# Altium schematic symbol library TI Power Management Shunt Voltage Reference.SchLib: 1526 symbols (part 14 of 18) (continued)
## TLV431AIDBVR
designator U?
Low Voltage Adjustable Precision Shunt Regulator, 39 ppm / degC, 15 mA, -40 to 85 degC, 5-pin SOT-23 (DBV), Green (RoHS & no Sb/Br); Manufacturer: Texas Instruments; PartNumber: TLV431AIDBVR; Initial Accuracy @ 25/deg C(%): 1; Iout/Iz(Max)(mA): 15; Min Iz for Regulation(uA): 80; Rating: Catalog; SubFamily: Shunt Voltage Reference; Temp Coeff(Max)(ppm/ degree C): 129; Temp Coeff(Typ)(ppm/ degree C): 39; VO Adj(Max)(V): 6; VO Adj(Min)(V): 1.24; DatasheetVersion: SLVS139T; PackageVersion: 4073253-4/K; PackageReference: DBV5; PackageDescription: 5-Pin Plastic Small Outline, Body 1.60 ?2.90 mm, Pitch 0.95 mm; Supplier 1: Digi-Key; Supplier Part Number 1: 296-1984-2-ND; Supplier 2: Digi-Key; Supplier Part Number 2: 296-1984-1-ND; Supplier 3: Digi-Key; Supplier Part Number 3: 296-1984-6-ND; Supplier 4: Farnell; Supplier Part Number 4: 1287671; Supplier 5: Newark; Supplier Part Number 5: 76C8858; Supplier 6: Mouser; Supplier Part Number 6: 595-TLV431AIDBVR; Eco-Plan: Green (RoHS & no Sb/Br); Mounting Technology: Surface Mount; Code_JEDEC: MO-178; ComponentLink1Description: Manufacturer URL; ComponentLink1URL: http://www.ti.com/; ComponentLink2Description: Datasheet; ComponentLink2URL: http://www.ti.com/general/docs/lit/getliterature.tsp?genericPartNumber=TLV431A&fileType=pdf; ComponentLink3Description: Package Specification; ComponentLink3URL: http://www.ti.com/litv/pdf/mpds018i
footprint TI-DBV5_N (SOT23, 5-Leads, Body 2.9x1.6mm, Pitch 0.95mm, IPC Medium Density)
part A pins: 3 CATHODE, 4 REF (in), 5 ANODE
part B pins: 1 NC "No internal connection", 2 NC "No internal connection"

## TLV431AIDBVRE4
designator U?
Low Voltage Adjustable Precision Shunt Regulator, 39 ppm / degC, 15 mA, -40 to 85 degC, 5-pin SOT-23 (DBV), Green (RoHS & no Sb/Br); Manufacturer: Texas Instruments; PartNumber: TLV431AIDBVRE4; Initial Accuracy @ 25/deg C(%): 1; Iout/Iz(Max)(mA): 15; Min Iz for Regulation(uA): 80; Rating: Catalog; SubFamily: Shunt Voltage Reference; Temp Coeff(Max)(ppm/ degree C): 129; Temp Coeff(Typ)(ppm/ degree C): 39; VO Adj(Max)(V): 6; VO Adj(Min)(V): 1.24; DatasheetVersion: SLVS139T; PackageVersion: 4073253-4/K; PackageReference: DBV5; PackageDescription: 5-Pin Plastic Small Outline, Body 1.60 ?2.90 mm, Pitch 0.95 mm; Supplier 1: Digi-Key; Supplier Part Number 1: TLV431AIDBVRE4-ND; Supplier 2: Farnell; Supplier Part Number 2: 1287672; Supplier 3: Newark; Supplier Part Number 3: 26M4183; Supplier 4: Mouser; Supplier Part Number 4: 595-TLV431AIDBVRE4; Eco-Plan: Green (RoHS & no Sb/Br); Mounting Technology: Surface Mount; Code_JEDEC: MO-178; ComponentLink1Description: Manufacturer URL; ComponentLink1URL: http://www.ti.com/; ComponentLink2Description: Datasheet; ComponentLink2URL: http://www.ti.com/general/docs/lit/getliterature.tsp?genericPartNumber=TLV431A&fileType=pdf; ComponentLink3Description: Package Specification; ComponentLink3URL: http://www.ti.com/litv/pdf/mpds018i
footprint TI-DBV5_N (SOT23, 5-Leads, Body 2.9x1.6mm, Pitch 0.95mm, IPC Medium Density)
part A pins: 3 CATHODE, 4 REF (in), 5 ANODE
part B pins: 1 NC "No internal connection", 2 NC "No internal connection"

## TLV431AIDBVRG4
designator U?
Low Voltage Adjustable Precision Shunt Regulator, 39 ppm / degC, 15 mA, -40 to 85 degC, 5-pin SOT-23 (DBV), Green (RoHS & no Sb/Br); Manufacturer: Texas Instruments; PartNumber: TLV431AIDBVRG4; Initial Accuracy @ 25/deg C(%): 1; Iout/Iz(Max)(mA): 15; Min Iz for Regulation(uA): 80; Rating: Catalog; SubFamily: Shunt Voltage Reference; Temp Coeff(Max)(ppm/ degree C): 129; Temp Coeff(Typ)(ppm/ degree C): 39; VO Adj(Max)(V): 6; VO Adj(Min)(V): 1.24; DatasheetVersion: SLVS139T; PackageVersion: 4073253-4/K; PackageReference: DBV5; PackageDescription: 5-Pin Plastic Small Outline, Body 1.60 ?2.90 mm, Pitch 0.95 mm; Supplier 1: Digi-Key; Supplier Part Number 1: TLV431AIDBVRG4-ND; Supplier 2: Newark; Supplier Part Number 2: 46M9061; Supplier 3: Mouser; Supplier Part Number 3: 595-TLV431AIDBVRG4; Eco-Plan: Green (RoHS & no Sb/Br); Mounting Technology: Surface Mount; Code_JEDEC: MO-178; ComponentLink1Description: Manufacturer URL; ComponentLink1URL: http://www.ti.com/; ComponentLink2Description: Datasheet; ComponentLink2URL: http://www.ti.com/general/docs/lit/getliterature.tsp?genericPartNumber=TLV431A&fileType=pdf; ComponentLink3Description: Package Specification; ComponentLink3URL: http://www.ti.com/litv/pdf/mpds018i
footprint TI-DBV5_N (SOT23, 5-Leads, Body 2.9x1.6mm, Pitch 0.95mm, IPC Medium Density)
part A pins: 3 CATHODE, 4 REF (in), 5 ANODE
part B pins: 1 NC "No internal connection", 2 NC "No internal connection"

## TLV431AIDBVT
designator U?
Low Voltage Adjustable Precision Shunt Regulator, 39 ppm / degC, 15 mA, -40 to 85 degC, 5-pin SOT-23 (DBV), Green (RoHS & no Sb/Br); Manufacturer: Texas Instruments; PartNumber: TLV431AIDBVT; Initial Accuracy @ 25/deg C(%): 1; Iout/Iz(Max)(mA): 15; Min Iz for Regulation(uA): 80; Rating: Catalog; SubFamily: Shunt Voltage Reference; Temp Coeff(Max)(ppm/ degree C): 129; Temp Coeff(Typ)(ppm/ degree C): 39; VO Adj(Max)(V): 6; VO Adj(Min)(V): 1.24; DatasheetVersion: SLVS139T; PackageVersion: 4073253-4/K; PackageReference: DBV5; PackageDescription: 5-Pin Plastic Small Outline, Body 1.60 ?2.90 mm, Pitch 0.95 mm; Supplier 1: Digi-Key; Supplier Part Number 1: 296-26826-2-ND; Supplier 2: Digi-Key; Supplier Part Number 2: 296-26826-1-ND; Supplier 3: Digi-Key; Supplier Part Number 3: 296-26826-6-ND; Supplier 4: Newark; Supplier Part Number 4: 67H1744; Supplier 5: Mouser; Supplier Part Number 5: 595-TLV431AIDBVT; Eco-Plan: Green (RoHS & no Sb/Br); Mounting Technology: Surface Mount; Code_JEDEC: MO-178; ComponentLink1Description: Manufacturer URL; ComponentLink1URL: http://www.ti.com/; ComponentLink2Description: Datasheet; ComponentLink2URL: http://www.ti.com/general/docs/lit/getliterature.tsp?genericPartNumber=TLV431A&fileType=pdf; ComponentLink3Description: Package Specification; ComponentLink3URL: http://www.ti.com/litv/pdf/mpds018i
footprint TI-DBV5_N (SOT23, 5-Leads, Body 2.9x1.6mm, Pitch 0.95mm, IPC Medium Density)
part A pins: 3 CATHODE, 4 REF (in), 5 ANODE
part B pins: 1 NC "No internal connection", 2 NC "No internal connection"

## TLV431AIDBVTE4
designator U?
Low Voltage Adjustable Precision Shunt Regulator, 39 ppm / degC, 15 mA, -40 to 85 degC, 5-pin SOT-23 (DBV), Green (RoHS & no Sb/Br); Manufacturer: Texas Instruments; PartNumber: TLV431AIDBVTE4; Initial Accuracy @ 25/deg C(%): 1; Iout/Iz(Max)(mA): 15; Min Iz for Regulation(uA): 80; Rating: Catalog; SubFamily: Shunt Voltage Reference; Temp Coeff(Max)(ppm/ degree C): 129; Temp Coeff(Typ)(ppm/ degree C): 39; VO Adj(Max)(V): 6; VO Adj(Min)(V): 1.24; DatasheetVersion: SLVS139T; PackageVersion: 4073253-4/K; PackageReference: DBV5; PackageDescription: 5-Pin Plastic Small Outline, Body 1.60 ?2.90 mm, Pitch 0.95 mm; Supplier 1: Digi-Key; Supplier Part Number 1: TLV431AIDBVTE4-ND; Supplier 2: Mouser; Supplier Part Number 2: 595-TLV431AIDBVTE4; Eco-Plan: Green (RoHS & no Sb/Br); Mounting Technology: Surface Mount; Code_JEDEC: MO-178; ComponentLink1Description: Manufacturer URL; ComponentLink1URL: http://www.ti.com/; ComponentLink2Description: Datasheet; ComponentLink2URL: http://www.ti.com/general/docs/lit/getliterature.tsp?genericPartNumber=TLV431A&fileType=pdf; ComponentLink3Description: Package Specification; ComponentLink3URL: http://www.ti.com/litv/pdf/mpds018i
footprint TI-DBV5_N (SOT23, 5-Leads, Body 2.9x1.6mm, Pitch 0.95mm, IPC Medium Density)
part A pins: 3 CATHODE, 4 REF (in), 5 ANODE
part B pins: 1 NC "No internal connection", 2 NC "No internal connection"

## TLV431AIDBVTG4
designator U?
Low Voltage Adjustable Precision Shunt Regulator, 39 ppm / degC, 15 mA, -40 to 85 degC, 5-pin SOT-23 (DBV), Green (RoHS & no Sb/Br); Manufacturer: Texas Instruments; PartNumber: TLV431AIDBVTG4; Initial Accuracy @ 25/deg C(%): 1; Iout/Iz(Max)(mA): 15; Min Iz for Regulation(uA): 80; Rating: Catalog; SubFamily: Shunt Voltage Reference; Temp Coeff(Max)(ppm/ degree C): 129; Temp Coeff(Typ)(ppm/ degree C): 39; VO Adj(Max)(V): 6; VO Adj(Min)(V): 1.24; DatasheetVersion: SLVS139T; PackageVersion: 4073253-4/K; PackageReference: DBV5; PackageDescription: 5-Pin Plastic Small Outline, Body 1.60 ?2.90 mm, Pitch 0.95 mm; Supplier 1: Digi-Key; Supplier Part Number 1: TLV431AIDBVTG4-ND; Supplier 2: Newark; Supplier Part Number 2: 46M9062; Supplier 3: Mouser; Supplier Part Number 3: 595-TLV431AIDBVTG4; Eco-Plan: Green (RoHS & no Sb/Br); Mounting Technology: Surface Mount; Code_JEDEC: MO-178; ComponentLink1Description: Manufacturer URL; ComponentLink1URL: http://www.ti.com/; ComponentLink2Description: Datasheet; ComponentLink2URL: http://www.ti.com/general/docs/lit/getliterature.tsp?genericPartNumber=TLV431A&fileType=pdf; ComponentLink3Description: Package Specification; ComponentLink3URL: http://www.ti.com/litv/pdf/mpds018i
footprint TI-DBV5_N (SOT23, 5-Leads, Body 2.9x1.6mm, Pitch 0.95mm, IPC Medium Density)
part A pins: 3 CATHODE, 4 REF (in), 5 ANODE
part B pins: 1 NC "No internal connection", 2 NC "No internal connection"

## TLV431AIDBZR
designator U?
Low Voltage Adjustable Precision Shunt Regulator, 39 ppm / degC, 15 mA, -40 to 85 degC, 3-pin SOT-23 (DBZ), Green (RoHS & no Sb/Br); Manufacturer: Texas Instruments; PartNumber: TLV431AIDBZR; Initial Accuracy @ 25/deg C(%): 1; Iout/Iz(Max)(mA): 15; Min Iz for Regulation(uA): 80; Rating: Catalog; SubFamily: Shunt Voltage Reference; Temp Coeff(Max)(ppm/ degree C): 129; Temp Coeff(Typ)(ppm/ degree C): 39; VO Adj(Max)(V): 6; VO Adj(Min)(V): 1.24; DatasheetVersion: SLVS139T; PackageVersion: 4203227/B; PackageReference: DBZ3; PackageDescription: 3-Pin Plastic Small Outline, Body 2.92 x 1.3 mm, Pitch 0.95 mm; Supplier 1: Digi-Key; Supplier Part Number 1: 296-18913-2-ND; Supplier 2: Digi-Key; Supplier Part Number 2: 296-18913-1-ND; Supplier 3: Digi-Key; Supplier Part Number 3: 296-18913-6-ND; Supplier 4: Farnell; Supplier Part Number 4: 2144315; Supplier 5: Newark; Supplier Part Number 5: 21J9151; Supplier 6: Newark; Supplier Part Number 6: 46W1551; Supplier 7: Mouser; Supplier Part Number 7: 595-TLV431AIDBZR; Eco-Plan: Green (RoHS & no Sb/Br); Mounting Technology: Surface Mount; Code_JEDEC: TO-236; ComponentLink1Description: Manufacturer URL; ComponentLink1URL: http://www.ti.com/; ComponentLink2Description: Datasheet; ComponentLink2URL: http://www.ti.com/general/docs/lit/getliterature.tsp?genericPartNumber=TLV431A&fileType=pdf; ComponentLink3Description: Package Specification; ComponentLink3URL: http://www.ti.com/litv/pdf/mpds108a
footprint TI-DBZ3_N (SOT23, 3-Leads, Body 2.92x1.3 mm, Pitch 0.95 mm, IPC Medium Density)
pins: 1 REF (in), 2 CATHODE, 3 ANODE

## TLV431AIDBZRG4
designator U?
Low Voltage Adjustable Precision Shunt Regulator, 39 ppm / degC, 15 mA, -40 to 85 degC, 3-pin SOT-23 (DBZ), Green (RoHS & no Sb/Br); Manufacturer: Texas Instruments; PartNumber: TLV431AIDBZRG4; Initial Accuracy @ 25/deg C(%): 1; Iout/Iz(Max)(mA): 15; Min Iz for Regulation(uA): 80; Rating: Catalog; SubFamily: Shunt Voltage Reference; Temp Coeff(Max)(ppm/ degree C): 129; Temp Coeff(Typ)(ppm/ degree C): 39; VO Adj(Max)(V): 6; VO Adj(Min)(V): 1.24; DatasheetVersion: SLVS139T; PackageVersion: 4203227/B; PackageReference: DBZ3; PackageDescription: 3-Pin Plastic Small Outline, Body 2.92 x 1.3 mm, Pitch 0.95 mm; Supplier 1: Digi-Key; Supplier Part Number 1: TLV431AIDBZRG4-ND; Supplier 2: Newark; Supplier Part Number 2: 31K7720; Supplier 3: Mouser; Supplier Part Number 3: 595-TLV431AIDBZRG4; Eco-Plan: Green (RoHS & no Sb/Br); Mounting Technology: Surface Mount; Code_JEDEC: TO-236; ComponentLink1Description: Manufacturer URL; ComponentLink1URL: http://www.ti.com/; ComponentLink2Description: Datasheet; ComponentLink2URL: http://www.ti.com/general/docs/lit/getliterature.tsp?genericPartNumber=TLV431A&fileType=pdf; ComponentLink3Description: Package Specification; ComponentLink3URL: http://www.ti.com/litv/pdf/mpds108a
footprint TI-DBZ3_N (SOT23, 3-Leads, Body 2.92x1.3 mm, Pitch 0.95 mm, IPC Medium Density)
pins: 1 REF (in), 2 CATHODE, 3 ANODE

## TLV431AIDE4
designator U?
Low Voltage Adjustable Precision Shunt Regulator, 39 ppm / degC, 15 mA, -40 to 85 degC, 8-pin SOIC (D), Green (RoHS & no Sb/Br); Manufacturer: Texas Instruments; PartNumber: TLV431AIDE4; Initial Accuracy @ 25/deg C(%): 1; Iout/Iz(Max)(mA): 15; Min Iz for Regulation(uA): 80; Rating: Catalog; SubFamily: Shunt Voltage Reference; Temp Coeff(Max)(ppm/ degree C): 129; Temp Coeff(Typ)(ppm/ degree C): 39; VO Adj(Max)(V): 6; VO Adj(Min)(V): 1.24; DatasheetVersion: SLVS139T; PackageVersion: 4040047-3/M; PackageReference: D8; PackageDescription: 8-Pin Plastic Small Outline, Body 4.9 x 3.9 mm, Pitch 1.27 mm; Supplier 1: Digi-Key; Supplier Part Number 1: TLV431AIDE4-ND; Supplier 2: Newark; Supplier Part Number 2: 37K4251; Supplier 3: Mouser; Supplier Part Number 3: 595-TLV431AIDE4; Eco-Plan: Green (RoHS & no Sb/Br); Mounting Technology: Surface Mount; Code_JEDEC: MS-012; ComponentLink1Description: Manufacturer URL; ComponentLink1URL: http://www.ti.com/; ComponentLink2Description: Datasheet; ComponentLink2URL: http://www.ti.com/general/docs/lit/getliterature.tsp?genericPartNumber=TLV431A&fileType=pdf; ComponentLink3Description: Package Specification; ComponentLink3URL: http://www.ti.com/litv/pdf/msoi002j
footprint TI-D8_N (SOIC, 8-Leads, Body 4.9x3.9mm, Pitch 1.27mm, IPC Medium Density)
part A pins: 1 CATHODE, 2 ANODE, 3 ANAODE, 6 ANODE, 7 ANODE, 8 REF (in)
part B pins: 4 NC, 5 NC

## TLV431AIDG4
designator U?
Low Voltage Adjustable Precision Shunt Regulator, 39 ppm / degC, 15 mA, -40 to 85 degC, 8-pin SOIC (D), Green (RoHS & no Sb/Br); Manufacturer: Texas Instruments; PartNumber: TLV431AIDG4; Initial Accuracy @ 25/deg C(%): 1; Iout/Iz(Max)(mA): 15; Min Iz for Regulation(uA): 80; Rating: Catalog; SubFamily: Shunt Voltage Reference; Temp Coeff(Max)(ppm/ degree C): 129; Temp Coeff(Typ)(ppm/ degree C): 39; VO Adj(Max)(V): 6; VO Adj(Min)(V): 1.24; DatasheetVersion: SLVS139T; PackageVersion: 4040047-3/M; PackageReference: D8; PackageDescription: 8-Pin Plastic Small Outline, Body 4.9 x 3.9 mm, Pitch 1.27 mm; Supplier 1: Digi-Key; Supplier Part Number 1: TLV431AIDG4-ND; Supplier 2: Newark; Supplier Part Number 2: 41M5520; Supplier 3: Mouser; Supplier Part Number 3: 595-TLV431AIDG4; Eco-Plan: Green (RoHS & no Sb/Br); Mounting Technology: Surface Mount; Code_JEDEC: MS-012; ComponentLink1Description: Manufacturer URL; ComponentLink1URL: http://www.ti.com/; ComponentLink2Description: Datasheet; ComponentLink2URL: http://www.ti.com/general/docs/lit/getliterature.tsp?genericPartNumber=TLV431A&fileType=pdf; ComponentLink3Description: Package Specification; ComponentLink3URL: http://www.ti.com/litv/pdf/msoi002j
footprint TI-D8_N (SOIC, 8-Leads, Body 4.9x3.9mm, Pitch 1.27mm, IPC Medium Density)
part A pins: 1 CATHODE, 2 ANODE, 3 ANAODE, 6 ANODE, 7 ANODE, 8 REF (in)
part B pins: 4 NC, 5 NC

## TLV431AIDR
designator U?
Low Voltage Adjustable Precision Shunt Regulator, 39 ppm / degC, 15 mA, -40 to 85 degC, 8-pin SOIC (D), Green (RoHS & no Sb/Br); Manufacturer: Texas Instruments; PartNumber: TLV431AIDR; Initial Accuracy @ 25/deg C(%): 1; Iout/Iz(Max)(mA): 15; Min Iz for Regulation(uA): 80; Rating: Catalog; SubFamily: Shunt Voltage Reference; Temp Coeff(Max)(ppm/ degree C): 129; Temp Coeff(Typ)(ppm/ degree C): 39; VO Adj(Max)(V): 6; VO Adj(Min)(V): 1.24; DatasheetVersion: SLVS139T; PackageVersion: 4040047-3/M; PackageReference: D8; PackageDescription: 8-Pin Plastic Small Outline, Body 4.9 x 3.9 mm, Pitch 1.27 mm; Supplier 1: Digi-Key; Supplier Part Number 1: 296-15032-2-ND; Supplier 2: Digi-Key; Supplier Part Number 2: 296-15032-1-ND; Supplier 3: Digi-Key; Supplier Part Number 3: 296-15032-6-ND; Supplier 4: Newark; Supplier Part Number 4: 76C8859; Supplier 5: Mouser; Supplier Part Number 5: 595-TLV431AIDR; Eco-Plan: Green (RoHS & no Sb/Br); Mounting Technology: Surface Mount; Code_JEDEC: MS-012; ComponentLink1Description: Manufacturer URL; ComponentLink1URL: http://www.ti.com/; ComponentLink2Description: Datasheet; ComponentLink2URL: http://www.ti.com/general/docs/lit/getliterature.tsp?genericPartNumber=TLV431A&fileType=pdf; ComponentLink3Description: Package Specification; ComponentLink3URL: http://www.ti.com/litv/pdf/msoi002j
footprint TI-D8_N (SOIC, 8-Leads, Body 4.9x3.9mm, Pitch 1.27mm, IPC Medium Density)
part A pins: 1 CATHODE, 2 ANODE, 3 ANAODE, 6 ANODE, 7 ANODE, 8 REF (in)
part B pins: 4 NC, 5 NC

## TLV431AIDRE4
designator U?
Low Voltage Adjustable Precision Shunt Regulator, 39 ppm / degC, 15 mA, -40 to 85 degC, 8-pin SOIC (D), Green (RoHS & no Sb/Br); Manufacturer: Texas Instruments; PartNumber: TLV431AIDRE4; Initial Accuracy @ 25/deg C(%): 1; Iout/Iz(Max)(mA): 15; Min Iz for Regulation(uA): 80; Rating: Catalog; SubFamily: Shunt Voltage Reference; Temp Coeff(Max)(ppm/ degree C): 129; Temp Coeff(Typ)(ppm/ degree C): 39; VO Adj(Max)(V): 6; VO Adj(Min)(V): 1.24; DatasheetVersion: SLVS139T; PackageVersion: 4040047-3/M; PackageReference: D8; PackageDescription: 8-Pin Plastic Small Outline, Body 4.9 x 3.9 mm, Pitch 1.27 mm; Supplier 1: Digi-Key; Supplier Part Number 1: TLV431AIDRE4-ND; Supplier 2: Mouser; Supplier Part Number 2: 595-TLV431AIDRE4; Eco-Plan: Green (RoHS & no Sb/Br); Mounting Technology: Surface Mount; Code_JEDEC: MS-012; ComponentLink1Description: Manufacturer URL; ComponentLink1URL: http://www.ti.com/; ComponentLink2Description: Datasheet; ComponentLink2URL: http://www.ti.com/general/docs/lit/getliterature.tsp?genericPartNumber=TLV431A&fileType=pdf; ComponentLink3Description: Package Specification; ComponentLink3URL: http://www.ti.com/litv/pdf/msoi002j
footprint TI-D8_N (SOIC, 8-Leads, Body 4.9x3.9mm, Pitch 1.27mm, IPC Medium Density)
part A pins: 1 CATHODE, 2 ANODE, 3 ANAODE, 6 ANODE, 7 ANODE, 8 REF (in)
part B pins: 4 NC, 5 NC

## TLV431AIDRG4
designator U?
Low Voltage Adjustable Precision Shunt Regulator, 39 ppm / degC, 15 mA, -40 to 85 degC, 8-pin SOIC (D), Green (RoHS & no Sb/Br); Manufacturer: Texas Instruments; PartNumber: TLV431AIDRG4; Initial Accuracy @ 25/deg C(%): 1; Iout/Iz(Max)(mA): 15; Min Iz for Regulation(uA): 80; Rating: Catalog; SubFamily: Shunt Voltage Reference; Temp Coeff(Max)(ppm/ degree C): 129; Temp Coeff(Typ)(ppm/ degree C): 39; VO Adj(Max)(V): 6; VO Adj(Min)(V): 1.24; DatasheetVersion: SLVS139T; PackageVersion: 4040047-3/M; PackageReference: D8; PackageDescription: 8-Pin Plastic Small Outline, Body 4.9 x 3.9 mm, Pitch 1.27 mm; Supplier 1: Digi-Key; Supplier Part Number 1: TLV431AIDRG4-ND; Supplier 2: Newark; Supplier Part Number 2: 41M5521; Supplier 3: Mouser; Supplier Part Number 3: 595-TLV431AIDRG4; Eco-Plan: Green (RoHS & no Sb/Br); Mounting Technology: Surface Mount; Code_JEDEC: MS-012; ComponentLink1Description: Manufacturer URL; ComponentLink1URL: http://www.ti.com/; ComponentLink2Description: Datasheet; ComponentLink2URL: http://www.ti.com/general/docs/lit/getliterature.tsp?genericPartNumber=TLV431A&fileType=pdf; ComponentLink3Description: Package Specification; ComponentLink3URL: http://www.ti.com/litv/pdf/msoi002j
footprint TI-D8_N (SOIC, 8-Leads, Body 4.9x3.9mm, Pitch 1.27mm, IPC Medium Density)
part A pins: 1 CATHODE, 2 ANODE, 3 ANAODE, 6 ANODE, 7 ANODE, 8 REF (in)
part B pins: 4 NC, 5 NC

## TLV431AILP
designator U?
Low Voltage Adjustable Precision Shunt Regulator, 39 ppm / degC, 15 mA, -40 to 85 degC, 3-pin TO-92 (LP), Pb-Free (RoHS); Manufacturer: Texas Instruments; PartNumber: TLV431AILP; Initial Accuracy @ 25/deg C(%): 1; Iout/Iz(Max)(mA): 15; Min Iz for Regulation(uA): 80; Rating: Catalog; SubFamily: Shunt Voltage Reference; Temp Coeff(Max)(ppm/ degree C): 129; Temp Coeff(Typ)(ppm/ degree C): 39; VO Adj(Max)(V): 6; VO Adj(Min)(V): 1.24; DatasheetVersion: SLVS139T; PackageVersion: 4040001-2/C; PackageReference: LP3; PackageDescription: Plastic Cylindrical Package, Formed Lead Option (TO-92); Supplier 1: Digi-Key; Supplier Part Number 1: 296-10725-5-ND; Supplier 2: Newark; Supplier Part Number 2: 76C8860; Supplier 3: Mouser; Supplier Part Number 3: 595-TLV431AILP; Eco-Plan: Pb-Free (RoHS); Mounting Technology: Through Hole; Code_JEDEC: TO-226; ComponentLink1Description: Manufacturer URL; ComponentLink1URL: http://www.ti.com/; ComponentLink2Description: Datasheet; ComponentLink2URL: http://www.ti.com/general/docs/lit/getliterature.tsp?genericPartNumber=TLV431A&fileType=pdf; ComponentLink3Description: Package Specification; ComponentLink3URL: http://www.ti.com/litv/pdf/msot002a
footprint TI-LP3 (TO, Flat Index; 3 In-Line, Formed Axial Leads; Body Dia. 4.8mm; Leads 0.56 x 0.41 mm (max))
pins: 1 REF (in), 2 ANODE, 3 CATHODE

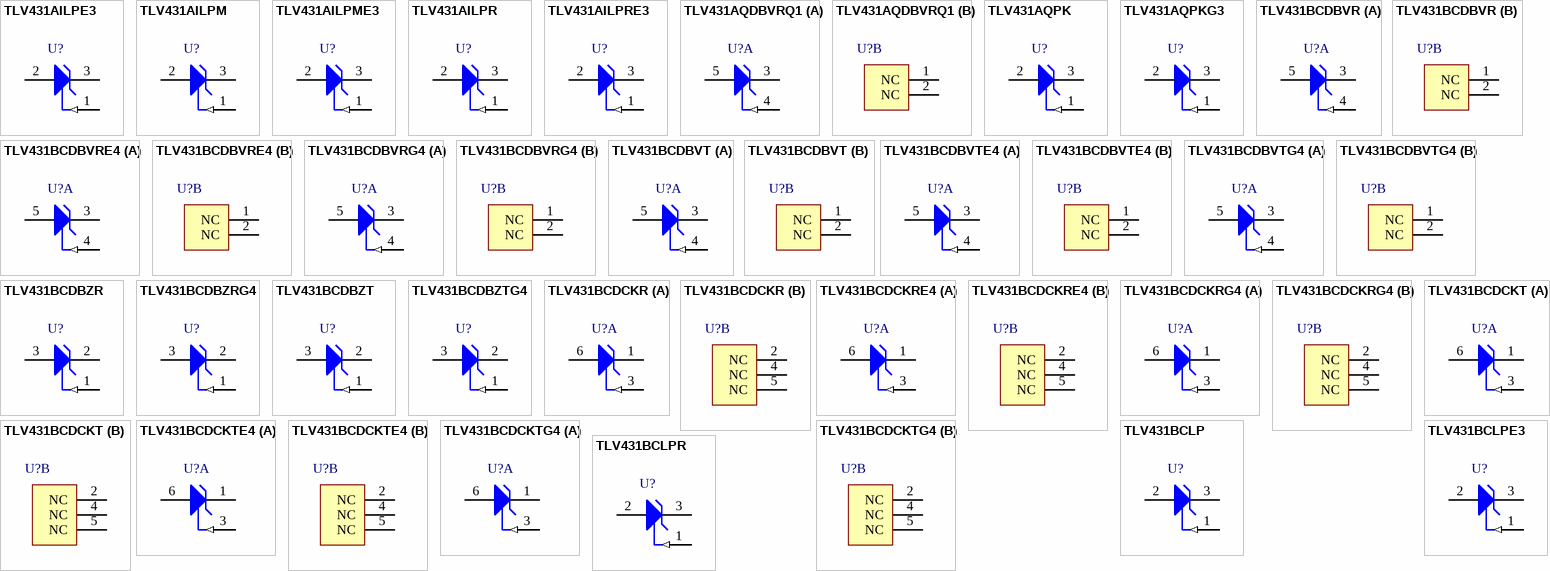
[diagram p44: symbols TLV431AILPE3 to TLV431BCLPR]

## TLV431AILPE3
designator U?
Low Voltage Adjustable Precision Shunt Regulator, 39 ppm / degC, 15 mA, -40 to 85 degC, 3-pin TO-92 (LP), Pb-Free (RoHS); Manufacturer: Texas Instruments; PartNumber: TLV431AILPE3; Initial Accuracy @ 25/deg C(%): 1; Iout/Iz(Max)(mA): 15; Min Iz for Regulation(uA): 80; Rating: Catalog; SubFamily: Shunt Voltage Reference; Temp Coeff(Max)(ppm/ degree C): 129; Temp Coeff(Typ)(ppm/ degree C): 39; VO Adj(Max)(V): 6; VO Adj(Min)(V): 1.24; DatasheetVersion: SLVS139T; PackageVersion: 4040001-2/C; PackageReference: LP3; PackageDescription: Plastic Cylindrical Package, Formed Lead Option (TO-92); Supplier 1: Digi-Key; Supplier Part Number 1: TLV431AILPE3-ND; Supplier 2: Newark; Supplier Part Number 2: 70K5553; Supplier 3: Mouser; Supplier Part Number 3: 595-TLV431AILPE3; Eco-Plan: Pb-Free (RoHS); Mounting Technology: Through Hole; Code_JEDEC: TO-226; ComponentLink1Description: Manufacturer URL; ComponentLink1URL: http://www.ti.com/; ComponentLink2Description: Datasheet; ComponentLink2URL: http://www.ti.com/general/docs/lit/getliterature.tsp?genericPartNumber=TLV431A&fileType=pdf; ComponentLink3Description: Package Specification; ComponentLink3URL: http://www.ti.com/litv/pdf/msot002a
footprint TI-LP3 (TO, Flat Index; 3 In-Line, Formed Axial Leads; Body Dia. 4.8mm; Leads 0.56 x 0.41 mm (max))
pins: 1 REF (in), 2 ANODE, 3 CATHODE

## TLV431AILPM
designator U?
Low Voltage Adjustable Precision Shunt Regulator, 39 ppm / degC, 15 mA, -40 to 85 degC, 3-pin TO-92 (LP), Pb-Free (RoHS); Manufacturer: Texas Instruments; PartNumber: TLV431AILPM; Initial Accuracy @ 25/deg C(%): 1; Iout/Iz(Max)(mA): 15; Min Iz for Regulation(uA): 80; Rating: Catalog; SubFamily: Shunt Voltage Reference; Temp Coeff(Max)(ppm/ degree C): 129; Temp Coeff(Typ)(ppm/ degree C): 39; VO Adj(Max)(V): 6; VO Adj(Min)(V): 1.24; DatasheetVersion: SLVS139T; PackageVersion: 4040001-2/C; PackageReference: LP3; PackageDescription: Plastic Cylindrical Package, Formed Lead Option (TO-92); Supplier 1: Digi-Key; Supplier Part Number 1: TLV431AILPM-ND; Supplier 2: Mouser; Supplier Part Number 2: 595-TLV431AILPM; Eco-Plan: Pb-Free (RoHS); Mounting Technology: Through Hole; Code_JEDEC: TO-226; ComponentLink1Description: Manufacturer URL; ComponentLink1URL: http://www.ti.com/; ComponentLink2Description: Datasheet; ComponentLink2URL: http://www.ti.com/general/docs/lit/getliterature.tsp?genericPartNumber=TLV431A&fileType=pdf; ComponentLink3Description: Package Specification; ComponentLink3URL: http://www.ti.com/litv/pdf/msot002a
footprint TI-LP3 (TO, Flat Index; 3 In-Line, Formed Axial Leads; Body Dia. 4.8mm; Leads 0.56 x 0.41 mm (max))
pins: 1 REF (in), 2 ANODE, 3 CATHODE

## TLV431AILPME3
designator U?
Low Voltage Adjustable Precision Shunt Regulator, 39 ppm / degC, 15 mA, -40 to 85 degC, 3-pin TO-92 (LP), Pb-Free (RoHS); Manufacturer: Texas Instruments; PartNumber: TLV431AILPME3; Initial Accuracy @ 25/deg C(%): 1; Iout/Iz(Max)(mA): 15; Min Iz for Regulation(uA): 80; Rating: Catalog; SubFamily: Shunt Voltage Reference; Temp Coeff(Max)(ppm/ degree C): 129; Temp Coeff(Typ)(ppm/ degree C): 39; VO Adj(Max)(V): 6; VO Adj(Min)(V): 1.24; DatasheetVersion: SLVS139T; PackageVersion: 4040001-2/C; PackageReference: LP3; PackageDescription: Plastic Cylindrical Package, Formed Lead Option (TO-92); Supplier 1: Digi-Key; Supplier Part Number 1: TLV431AILPME3-ND; Supplier 2: Farnell; Supplier Part Number 2: 1575308; Supplier 3: Newark; Supplier Part Number 3: 70K5554; Supplier 4: Mouser; Supplier Part Number 4: 595-TLV431AILPME3; Eco-Plan: Pb-Free (RoHS); Mounting Technology: Through Hole; Code_JEDEC: TO-226; ComponentLink1Description: Manufacturer URL; ComponentLink1URL: http://www.ti.com/; ComponentLink2Description: Datasheet; ComponentLink2URL: http://www.ti.com/general/docs/lit/getliterature.tsp?genericPartNumber=TLV431A&fileType=pdf; ComponentLink3Description: Package Specification; ComponentLink3URL: http://www.ti.com/litv/pdf/msot002a
footprint TI-LP3 (TO, Flat Index; 3 In-Line, Formed Axial Leads; Body Dia. 4.8mm; Leads 0.56 x 0.41 mm (max))
pins: 1 REF (in), 2 ANODE, 3 CATHODE

## TLV431AILPR
designator U?
Low Voltage Adjustable Precision Shunt Regulator, 39 ppm / degC, 15 mA, -40 to 85 degC, 3-pin TO-92 (LP), Pb-Free (RoHS); Manufacturer: Texas Instruments; PartNumber: TLV431AILPR; Initial Accuracy @ 25/deg C(%): 1; Iout/Iz(Max)(mA): 15; Min Iz for Regulation(uA): 80; Rating: Catalog; SubFamily: Shunt Voltage Reference; Temp Coeff(Max)(ppm/ degree C): 129; Temp Coeff(Typ)(ppm/ degree C): 39; VO Adj(Max)(V): 6; VO Adj(Min)(V): 1.24; DatasheetVersion: SLVS139T; PackageVersion: 4040001-2/C; PackageReference: LP3; PackageDescription: Plastic Cylindrical Package, Formed Lead Option (TO-92); Supplier 1: Digi-Key; Supplier Part Number 1: 296-24389-2-ND; Supplier 2: Digi-Key; Supplier Part Number 2: 296-24389-1-ND; Supplier 3: Digi-Key; Supplier Part Number 3: 296-24389-6-ND; Supplier 4: Mouser; Supplier Part Number 4: 595-TLV431AILPR; Eco-Plan: Pb-Free (RoHS); Mounting Technology: Through Hole; Code_JEDEC: TO-226; ComponentLink1Description: Manufacturer URL; ComponentLink1URL: http://www.ti.com/; ComponentLink2Description: Datasheet; ComponentLink2URL: http://www.ti.com/general/docs/lit/getliterature.tsp?genericPartNumber=TLV431A&fileType=pdf; ComponentLink3Description: Package Specification; ComponentLink3URL: http://www.ti.com/litv/pdf/msot002a
footprint TI-LP3 (TO, Flat Index; 3 In-Line, Formed Axial Leads; Body Dia. 4.8mm; Leads 0.56 x 0.41 mm (max))
pins: 1 REF (in), 2 ANODE, 3 CATHODE

## TLV431AILPRE3
designator U?
Low Voltage Adjustable Precision Shunt Regulator, 39 ppm / degC, 15 mA, -40 to 85 degC, 3-pin TO-92 (LP), Pb-Free (RoHS); Manufacturer: Texas Instruments; PartNumber: TLV431AILPRE3; Initial Accuracy @ 25/deg C(%): 1; Iout/Iz(Max)(mA): 15; Min Iz for Regulation(uA): 80; Rating: Catalog; SubFamily: Shunt Voltage Reference; Temp Coeff(Max)(ppm/ degree C): 129; Temp Coeff(Typ)(ppm/ degree C): 39; VO Adj(Max)(V): 6; VO Adj(Min)(V): 1.24; DatasheetVersion: SLVS139T; PackageVersion: 4040001-2/C; PackageReference: LP3; PackageDescription: Plastic Cylindrical Package, Formed Lead Option (TO-92); Supplier 1: Digi-Key; Supplier Part Number 1: TLV431AILPRE3-ND; Supplier 2: Newark; Supplier Part Number 2: 70K5555; Supplier 3: Mouser; Supplier Part Number 3: 595-TLV431AILPRE3; Eco-Plan: Pb-Free (RoHS); Mounting Technology: Through Hole; Code_JEDEC: TO-226; ComponentLink1Description: Manufacturer URL; ComponentLink1URL: http://www.ti.com/; ComponentLink2Description: Datasheet; ComponentLink2URL: http://www.ti.com/general/docs/lit/getliterature.tsp?genericPartNumber=TLV431A&fileType=pdf; ComponentLink3Description: Package Specification; ComponentLink3URL: http://www.ti.com/litv/pdf/msot002a
footprint TI-LP3 (TO, Flat Index; 3 In-Line, Formed Axial Leads; Body Dia. 4.8mm; Leads 0.56 x 0.41 mm (max))
pins: 1 REF (in), 2 ANODE, 3 CATHODE
